# Altium footprint library Alhambra_II.PcbLib: 43 footprints (part 1 of 3)
Each footprint in its own frame and in the unit in brackets; x right, y up, seen from the top. Pads: shape width x height; smd on the part's side, far side on the other; paste and mask are expansions set on the pad; w line width, h text height; cw(c..) or ccw(c..) is an arc to the next point about the centre after c.
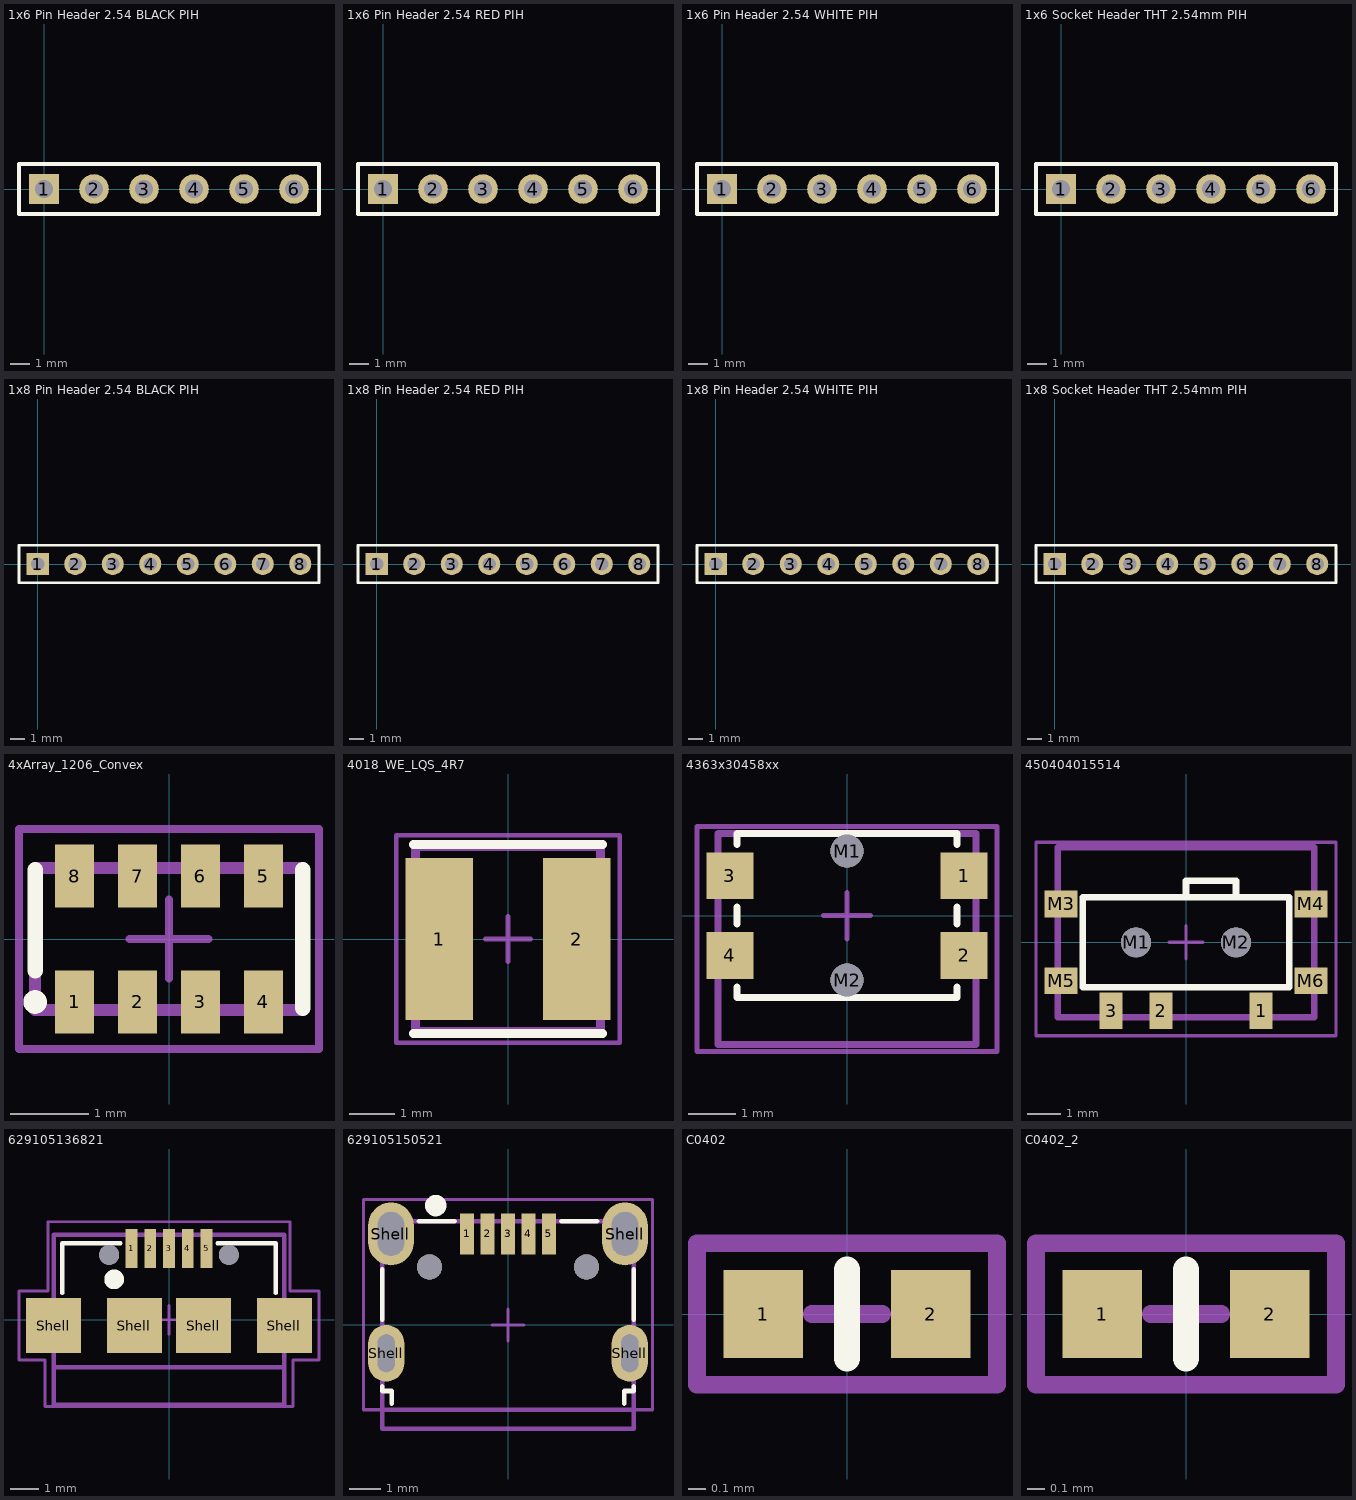
[diagram p0: the footprints below, top view; thin cyan lines are the x and y axes]

## 1x6 Pin Header 2.54 BLACK PIH [mm] "6 pin Header pitch 2.54mm Black PIH"
pads (6):
  rect 1.5x1.5 hole 0.9: 1(0,0)
  round 1.5 hole 0.9: 2(2.54,0) 3(5.08,0) 4(7.62,0) 5(10.16,0) 6(12.7,0)
Top Overlay:
  lines w0.2: -1.27,-1.27 13.97,-1.27 13.97,1.27 -1.27,1.27 -1.27,-1.27
Top Paste:
  circle w0.2: c7.62,0 r1
  circle w1: c7.62,0 r0.45
  circle w1: c10.16,0 r0.45
  circle w0.2: c10.16,0 r1
  circle w1: c12.7,0 r0.45
  circle w0.2: c12.7,0 r1
  circle w1: c5.08,0 r0.45
  circle w0.2: c5.08,0 r1
  circle w1: c2.54,0 r0.45
  circle w0.2: c2.54,0 r1
  circle w1: c0,0 r0.45
  circle w0.2: c0,0 r1
  rectangle: -0.85,-0.85 0.85,0.85
Mechanical 15:
  lines w0.1: -0.5,0 0.5,0 ; 0,-0.5 0,0.5 ; -1.27,-1.27 13.97,-1.27 13.97,1.27 -1.27,1.27 -1.27,-1.27
3D body "Header 6p negro.step": height 8.38, standoff -2.54, extent -1.27,-1.245 13.97,1.245

## 1x6 Pin Header 2.54 RED PIH [mm] "6 pin Header pitch 2.54mm Red PIH"
pads (6):
  rect 1.5x1.5 hole 0.9: 1(0,0)
  round 1.5 hole 0.9: 2(2.54,0) 3(5.08,0) 4(7.62,0) 5(10.16,0) 6(12.7,0)
Top Overlay:
  lines w0.2: -1.27,-1.27 -1.27,1.27 13.97,1.27 13.97,-1.27 -1.27,-1.27
Top Paste:
  circle w0.2: c7.62,0 r1
  circle w1: c7.62,0 r0.45
  circle w1: c10.16,0 r0.45
  circle w0.2: c10.16,0 r1
  circle w1: c12.7,0 r0.45
  circle w0.2: c12.7,0 r1
  circle w1: c5.08,0 r0.45
  circle w0.2: c5.08,0 r1
  circle w1: c2.54,0 r0.45
  circle w0.2: c2.54,0 r1
  circle w1: c0,0 r0.45
  circle w0.2: c0,0 r1
  rectangle: -0.85,-0.85 0.85,0.85
Mechanical 15:
  lines w0.1: -0.5,0 0.5,0 ; 0,-0.5 0,0.5 ; -1.27,-1.27 13.97,-1.27 13.97,1.27 -1.27,1.27 -1.27,-1.27
3D body "Header 6p rojo.step": height 8.38, standoff -2.54, extent -1.27,-1.245 13.97,1.245

## 1x6 Pin Header 2.54 WHITE PIH [mm] "6 pin Header pitch 2.54mm, White, PIH"
pads (6):
  rect 1.5x1.5 hole 0.9: 1(0,0)
  round 1.5 hole 0.9: 2(2.54,0) 3(5.08,0) 4(7.62,0) 5(10.16,0) 6(12.7,0)
Top Overlay:
  lines w0.2: -1.27,-1.27 13.97,-1.27 13.97,1.27 -1.27,1.27 -1.27,-1.27
Top Paste:
  circle w0.2: c0,0 r1
  circle w1: c0,0 r0.45
  circle w0.2: c2.54,0 r1
  circle w1: c2.54,0 r0.45
  circle w0.2: c5.08,0 r1
  circle w1: c5.08,0 r0.45
  circle w0.2: c12.7,0 r1
  circle w1: c12.7,0 r0.45
  circle w0.2: c10.16,0 r1
  circle w1: c10.16,0 r0.45
  circle w1: c7.62,0 r0.45
  circle w0.2: c7.62,0 r1
  rectangle: -0.85,-0.85 0.85,0.85
Mechanical 15:
  lines w0.1: -0.5,0 0.5,0 ; 0,-0.5 0,0.5 ; -1.27,-1.27 -1.27,1.27 13.97,1.27 13.97,-1.27 -1.27,-1.27
3D body "Header 6p beige.step": height 8.38, standoff -2.54, extent -1.27,-1.245 13.97,1.245

## 1x6 Socket Header THT 2.54mm PIH [mm] "6 Socket Header pitch 2.54mm PIH"
height 8.5
pads (6):
  rect 1.5x1.5 hole 0.9: 1(0,0)
  round 1.5 hole 0.9: 2(2.54,0) 3(5.08,0) 4(7.62,0) 5(10.16,0) 6(12.7,0)
Top Overlay:
  lines w0.2: -1.27,-1.27 13.97,-1.27 13.97,1.27 -1.27,1.27 -1.27,-1.27
Top Paste:
  circle w0.2: c12.7,0 r1.05
  circle w1.1: c12.7,0 r0.45
  circle w0.2: c10.16,0 r1.05
  circle w1.1: c10.16,0 r0.45
  circle w0.2: c7.62,0 r1.05
  circle w1.1: c7.62,0 r0.45
  circle w0.2: c5.08,0 r1.05
  circle w1.1: c5.08,0 r0.45
  circle w0.2: c2.54,0 r1.05
  circle w1.1: c2.54,0 r0.45
  circle w1.1: c0,0 r0.45
  circle w0.2: c0,0 r1.05
  rectangle: -0.85,-0.85 0.85,0.85
Mechanical 15:
  lines w0.1: -0.5,0 0.5,0 ; 0,-0.5 0,0.5 ; -1.27,-1.27 -1.27,1.27 13.97,1.27 13.97,-1.27 -1.27,-1.27
3D body "1x6-socket-header-2.54mm.step": height 8.3, standoff -3.55, extent -1.28,-1.27 13.96,1.27

## 1x8 Pin Header 2.54 BLACK PIH [mm] "8 pin Header pitch 2.54mm, BLACK, PIH"
pads (8):
  rect 1.5x1.5 hole 0.9: 1(0,0)
  round 1.5 hole 0.9: 2(2.54,0) 3(5.08,0) 4(7.62,0) 5(10.16,0) 6(12.7,0) 7(15.24,0) 8(17.78,0)
Top Overlay:
  lines w0.2: -1.27,-1.27 -1.27,1.27 19.05,1.27 19.05,-1.27 -1.27,-1.27
Top Paste:
  circle w0.2: c0,0 r1
  circle w1: c0,0 r0.45
  circle w0.2: c2.54,0 r1
  circle w1: c2.54,0 r0.45
  circle w0.2: c5.08,0 r1
  circle w1: c5.08,0 r0.45
  circle w0.2: c17.78,0 r1
  circle w1: c17.78,0 r0.45
  circle w0.2: c15.24,0 r1
  circle w1: c15.24,0 r0.45
  circle w0.2: c12.7,0 r1
  circle w1: c12.7,0 r0.45
  circle w0.2: c10.16,0 r1
  circle w1: c10.16,0 r0.45
  circle w1: c7.62,0 r0.45
  circle w0.2: c7.62,0 r1
  rectangle: -0.85,-0.85 0.85,0.85
Mechanical 15:
  lines w0.1: -0.5,0 0.5,0 ; 0,-0.5 0,0.5 ; -1.27,-1.27 -1.27,1.27 19.05,1.27 19.05,-1.27 -1.27,-1.27
3D body "Header 8p negro.step": height 8.38, standoff -2.54, extent -1.27,-1.219 19.05,1.27

## 1x8 Pin Header 2.54 RED PIH [mm] "8 pin Header pitch 2.54mm, Red PIH"
pads (8):
  rect 1.5x1.5 hole 0.9: 1(0,0)
  round 1.5 hole 0.9: 2(2.54,0) 3(5.08,0) 4(7.62,0) 5(10.16,0) 6(12.7,0) 7(15.24,0) 8(17.78,0)
Top Overlay:
  lines w0.2: -1.27,-1.27 -1.27,1.27 19.05,1.27 19.05,-1.27 -1.27,-1.27
Top Paste:
  circle w0.2: c7.62,0 r1
  circle w1: c7.62,0 r0.45
  circle w1: c10.16,0 r0.45
  circle w0.2: c10.16,0 r1
  circle w1: c12.7,0 r0.45
  circle w0.2: c12.7,0 r1
  circle w1: c15.24,0 r0.45
  circle w0.2: c15.24,0 r1
  circle w1: c17.78,0 r0.45
  circle w0.2: c17.78,0 r1
  circle w1: c5.08,0 r0.45
  circle w0.2: c5.08,0 r1
  circle w1: c2.54,0 r0.45
  circle w0.2: c2.54,0 r1
  circle w1: c0,0 r0.45
  circle w0.2: c0,0 r1
  rectangle: -0.85,-0.85 0.85,0.85
Mechanical 15:
  lines w0.1: -0.5,0 0.5,0 ; 0,-0.5 0,0.5 ; -1.27,-1.27 -1.27,1.27 19.05,1.27 19.05,-1.27 -1.27,-1.27
3D body "Header 8p rojo.step": height 8.38, standoff -2.54, extent -1.27,-1.219 19.05,1.27

## 1x8 Pin Header 2.54 WHITE PIH [mm] "8 pin Header pitch 2.54mm, White, PIH"
pads (8):
  rect 1.5x1.5 hole 0.9: 1(0,0)
  round 1.5 hole 0.9: 2(2.54,0) 3(5.08,0) 5(10.16,0) 6(12.7,0) 7(15.24,0) 8(17.78,0)
  round 1.5 hole 0.9 paste+0.35: 4(7.62,0)
Top Overlay:
  lines w0.2: -1.27,-1.27 -1.27,1.27 19.05,1.27 19.05,-1.27 -1.27,-1.27
Top Paste:
  circle w0.2: c7.62,0 r1
  circle w1: c7.62,0 r0.45
  circle w1: c10.16,0 r0.45
  circle w0.2: c10.16,0 r1
  circle w1: c12.7,0 r0.45
  circle w0.2: c12.7,0 r1
  circle w1: c15.24,0 r0.45
  circle w0.2: c15.24,0 r1
  circle w1: c17.78,0 r0.45
  circle w0.2: c17.78,0 r1
  circle w1: c5.08,0 r0.45
  circle w0.2: c5.08,0 r1
  circle w1: c2.54,0 r0.45
  circle w0.2: c2.54,0 r1
  circle w1: c0,0 r0.45
  circle w0.2: c0,0 r1
  rectangle: -0.85,-0.85 0.85,0.85
Mechanical 15:
  lines w0.1: -0.5,0 0.5,0 ; 0,-0.5 0,0.5 ; -1.27,-1.27 -1.27,1.27 19.05,1.27 19.05,-1.27 -1.27,-1.27
3D body "Header 8p beige.step": height 8.38, standoff -2.54, extent -1.295,-1.264 19.025,1.225

## 1x8 Socket Header THT 2.54mm PIH [mm] "8 Socket Header pitch 2.54mm PIH"
height 8.5
pads (8):
  rect 1.5x1.5 hole 0.9: 1(0,0)
  round 1.5 hole 0.9: 2(2.54,0) 3(5.08,0) 4(7.62,0) 5(10.16,0) 6(12.7,0) 7(15.24,0) 8(17.78,0)
Top Overlay:
  lines w0.2: -1.27,-1.27 19.05,-1.27 19.05,1.27 -1.27,1.27 -1.27,-1.27
Top Paste:
  circle w0.2: c17.78,0 r1.05
  circle w1.1: c17.78,0 r0.45
  circle w0.2: c0,0 r1.05
  circle w1.1: c0,0 r0.45
  circle w1.1: c2.54,0 r0.45
  circle w0.2: c2.54,0 r1.05
  circle w1.1: c5.08,0 r0.45
  circle w0.2: c5.08,0 r1.05
  circle w1.1: c7.62,0 r0.45
  circle w0.2: c7.62,0 r1.05
  circle w1.1: c10.16,0 r0.45
  circle w0.2: c10.16,0 r1.05
  circle w1.1: c12.7,0 r0.45
  circle w0.2: c12.7,0 r1.05
  circle w1.1: c15.24,0 r0.45
  circle w0.2: c15.24,0 r1.05
  rectangle: -0.85,-0.85 0.85,0.85
Mechanical 15:
  lines w0.1: -0.5,0 0.5,0 ; 0,-0.5 0,0.5 ; -1.27,-1.27 19.05,-1.27 19.05,1.27 -1.27,1.27 -1.27,-1.27
3D body "1x8-socket-header-2.54mm.step": height 8.3, standoff -3.55, extent -1.27,-1.27 19.05,1.27

## 4xArray_1206_Convex [mm] "4x array, 1206, Convex"
height 0.6
pads (8):
  rect 0.5x0.8 smd: 1(-1.2,-0.8) 2(-0.4,-0.8) 3(0.4,-0.8) 4(1.2,-0.8) 5(1.2,0.8) 6(0.4,0.8) 7(-0.4,0.8) 8(-1.2,0.8)
Top Overlay:
  circle w0.2: c-1.7,-0.8 r0.05
  lines w0.2: -1.7,-0.4 -1.7,0.875 ; 1.7,-0.875 1.7,0.875
Mechanical 13:
  lines w0.152: -1.7,-0.9 -1.7,0.9 1.7,0.9 1.7,-0.9 -1.7,-0.9
Mechanical 15:
  lines w0.1: -0.5,0 0.5,0 ; 0,-0.5 0,0.5 ; -1.905,-1.397 1.905,-1.397 1.905,1.397 -1.905,1.397 -1.905,-1.397
3D body "User Library-Array-1206-4Way-Var2-1.STEP": height 0.52, standoff 0.02, extent -1.6,-0.8 1.6,0.8

## 4018_WE_LQS_4R7 [mm] "SMD Power Inductor, 2-Leads, body 4x4mm"
height 1.8
pads (2):
  rect 1.5x3.6 smd: 1(-1.525,0) 2(1.525,0)
Top Overlay:
  lines w0.2: -2.1,-2.1 2.1,-2.1 ; -2.1,2.1 2.1,2.1
Mechanical 11:
  lines w0.1: -2,-2 2,-2 2,2 -2,2 -2,-2
Mechanical 13:
  lines w0.1: -2.1,-2.1 2.1,-2.1 2.1,2.1 -2.1,2.1 -2.1,-2.1
Mechanical 15:
  lines w0.1: -0.5,0 0.5,0 ; 0,-0.5 0,0.5 ; -2.475,-2.3 2.475,-2.3 2.475,2.3 -2.475,2.3 -2.475,-2.3
3D body "STEP-WE-LQS-4018-rev1-4R7.step": height 1.82, standoff 0.02, extent -2,-2 2,2

## 4363x30458xx [mm] "3.5x4.7 mm SMD J-Bend side push"
height 1.65
pads (6):
  rect 1x1 smd: 1(2.5,0.85) 2(2.5,-0.85) 3(-2.5,0.85) 4(-2.5,-0.85)
  round 0.7 hole 0.7 unplated: M1(0,1.375) M2(0,-1.375)
Top Overlay:
  lines w0.15: -2.35,-1.52 -2.35,-1.75 2.35,-1.75 2.35,-1.52 ; -2.35,-0.18 -2.35,0.18 ; -2.35,1.52 -2.35,1.75 2.35,1.75 2.35,1.52 ; 2.35,-0.18 2.35,0.18
Mechanical 13:
  lines w0.15: -2.75,-2.75 -2.75,1.75 2.75,1.75 2.75,-2.75 -2.75,-2.75
Mechanical 15:
  lines w0.1: -0.5,0 0.5,0 ; 0,-0.5 0,0.5 ; -3.2,-2.9 -3.2,1.9 3.2,1.9 3.2,-2.9 -3.2,-2.9
3D body "4363x30458xx.stp": height 1.67, standoff -0.48, extent -2.75,-2.75 2.75,1.75

## 450404015514 [mm] "Right angle Slide Switch"
height 1.4
pads (9):
  rect 0.7x1.1 smd: 1(2.25,-2.05) 2(-0.75,-2.05) 3(-2.25,-2.05)
  round 0.9 hole 0.9 unplated: M1(-1.5,0) M2(1.5,0)
  rect 1x0.8 smd: M3(-3.75,1.15) M4(3.75,1.15) M5(-3.75,-1.15) M6(3.75,-1.15)
Top Overlay:
  lines w0.2: 0,1.35 0,1.85 1.5,1.85 1.5,1.35 ; -3.1,-1.35 3.1,-1.35 3.1,1.35 -3.1,1.35 -3.1,-1.35
Mechanical 13:
  lines w0.2: -3.85,-2.25 3.85,-2.25 3.85,2.85 -3.85,2.85 -3.85,-2.25
Mechanical 15:
  lines w0.1: -0.5,0 0.5,0 ; 0,-0.5 0,0.5 ; -4.5,-2.8 4.5,-2.8 4.5,3 -4.5,3 -4.5,-2.8
3D body "450404015514.stp": height 1.42, standoff -0.48, extent -3.85,-2.25 3.85,2.88

## 629105136821 [mm] "Micro USB 2.0 SMT Type B Horizontal 5 Contacts"
height 3
pads (11):
  rect 0.4x1.35 smd: 1(-1.3,2.475) 2(-0.65,2.475) 3(0,2.475) 4(0.65,2.475) 5(1.3,2.475)
  rect 1.9x1.9 smd: Shell(-4,-0.2) Shell(-1.2,-0.2) Shell(1.2,-0.2) Shell(4,-0.2)
  round 0.7 hole 0.7 unplated: ""(-2.075,2.25) ""(2.075,2.25)
Top Overlay:
  circle w0.4: c-1.9,1.4 r0.141
  lines w0.15: -3.7,0.93 -3.7,2.65 -1.68,2.65 ; 1.68,2.65 3.7,2.65 3.7,0.93
Mechanical 13:
  lines w0.15: -4,-2.95 4,-2.95 4,2.95 -4,2.95 -4,-2.95
Mechanical 15:
  lines w0.1: -0.5,0 0.5,0 ; 0,-0.5 0,0.5 ; -5.2,-1.4 -5.2,1 -4.2,1 -4.2,3.4 1.9,3.4 4.2,3.4 4.2,1 5.2,1 5.2,-1.4 4.3,-1.4 4.3,-3 -4.3,-3 -4.3,-1.4 -5.2,-1.4
  lines w0.15: -4,-1.65 4,-1.65
  text "PCB Edge" at -1.8,-2.45 h1
3D body "629105136821.stp": height 2.75, standoff -0.61, extent -4,-2.95 4,2.973

## 629105150521 [mm] "Micro USB 2.0 SMT Type B Horizontal 5 Contacts High Current"
height 2.66
pads (11):
  rect 0.45x1.3 smd: 1(-1.3,2.9) 2(-0.65,2.9) 3(0,2.9) 4(0.65,2.9) 5(1.3,2.9)
  oval 1.15x1.8 hole 0.55 slot 1.2 at 90 deg: Shell(-3.875,-0.9) Shell(3.875,-0.9)
  oval 1.45x2 hole 0.85 slot 1.4 at 90 deg: Shell(-3.725,2.9) Shell(3.725,2.9)
  round 0.8 hole 0.8 unplated: ""(-2.5,1.85) ""(2.5,1.85)
Top Overlay:
  circle w0.4: c-2.3,3.8 r0.141
  lines w0.15: -4,-1.96 -4,-2.1 -3.7,-2.1 -3.7,-2.5 ; -4,0.17 -4,1.77 ; -2.83,3.3 -1.7,3.3 ; 1.7,3.3 2.83,3.3 ; 3.7,-2.5 3.7,-2.1 4,-2.1 4,-1.96 ; 4,0.17 4,1.77 ; -3.7,-2.5 -3.7,-2.5
Top Paste:
  drawing of 4 lines, arcs and shapes, not listed
Mechanical 13:
  lines w0.15: -4,-3.3 -4,3.3 4,3.3 4,-3.3 -4,-3.3
Mechanical 15:
  lines w0.1: -4,-2.7 -4.5,-2.7 -4.6,-2.7 -4.6,4 4.6,4 4.6,-2.2 4.6,-2.7 4,-2.7 ; -0.5,0 0.5,0 ; 0,-0.5 0,0.5
  lines w0.15: -4,-2.7 4,-2.7
  text "PCB Edge" at -1.9,-2.4 h1
3D body "Download_STP_629105150521.stp": height 2.71, standoff -0.85, extent -4,-3.3 4,3.303

## C0402 [mm] "Chip Capacitor, Body 1.0x0.5mm, IPC High Density"
height 0.5
pads (2):
  rect 0.45x0.5 smd: 1(-0.475,0) 2(0.475,0)
Top Overlay:
  lines w0.15: 0,-0.25 0,0.25
Mechanical 15:
  lines w0.1: -0.2,0 0.2,0 ; 0,-0.2 0,0.2 ; -0.85,-0.4 -0.85,0.4 0.85,0.4 0.85,-0.4 -0.85,-0.4
3D body "C_0402.step": height 0.5, standoff 0, extent -0.492,-0.25 0.493,0.25

## C0402_2 [mm]
pads (2):
  rect 0.45x0.5 smd: 1(-0.475,0) 2(0.475,0)
Top Overlay:
  lines w0.15: 0,-0.25 0,0.25
Mechanical 15:
  lines w0.1: -0.2,0 0.2,0 ; 0,-0.2 0,0.2 ; -0.85,-0.4 -0.85,0.4 0.85,0.4 0.85,-0.4 -0.85,-0.4
3D body "C_0402.step": height 0.5, standoff 0, extent -0.492,-0.25 0.493,0.25